# Altium footprint library 陪测板.PcbLib: 72 footprints (part 4 of 5)
Each footprint in its own frame and in the unit in brackets; x right, y up, seen from the top. Pads: shape width x height; smd on the part's side, far side on the other; paste and mask are expansions set on the pad; w line width, h text height; cw(c..) or ccw(c..) is an arc to the next point about the centre after c.
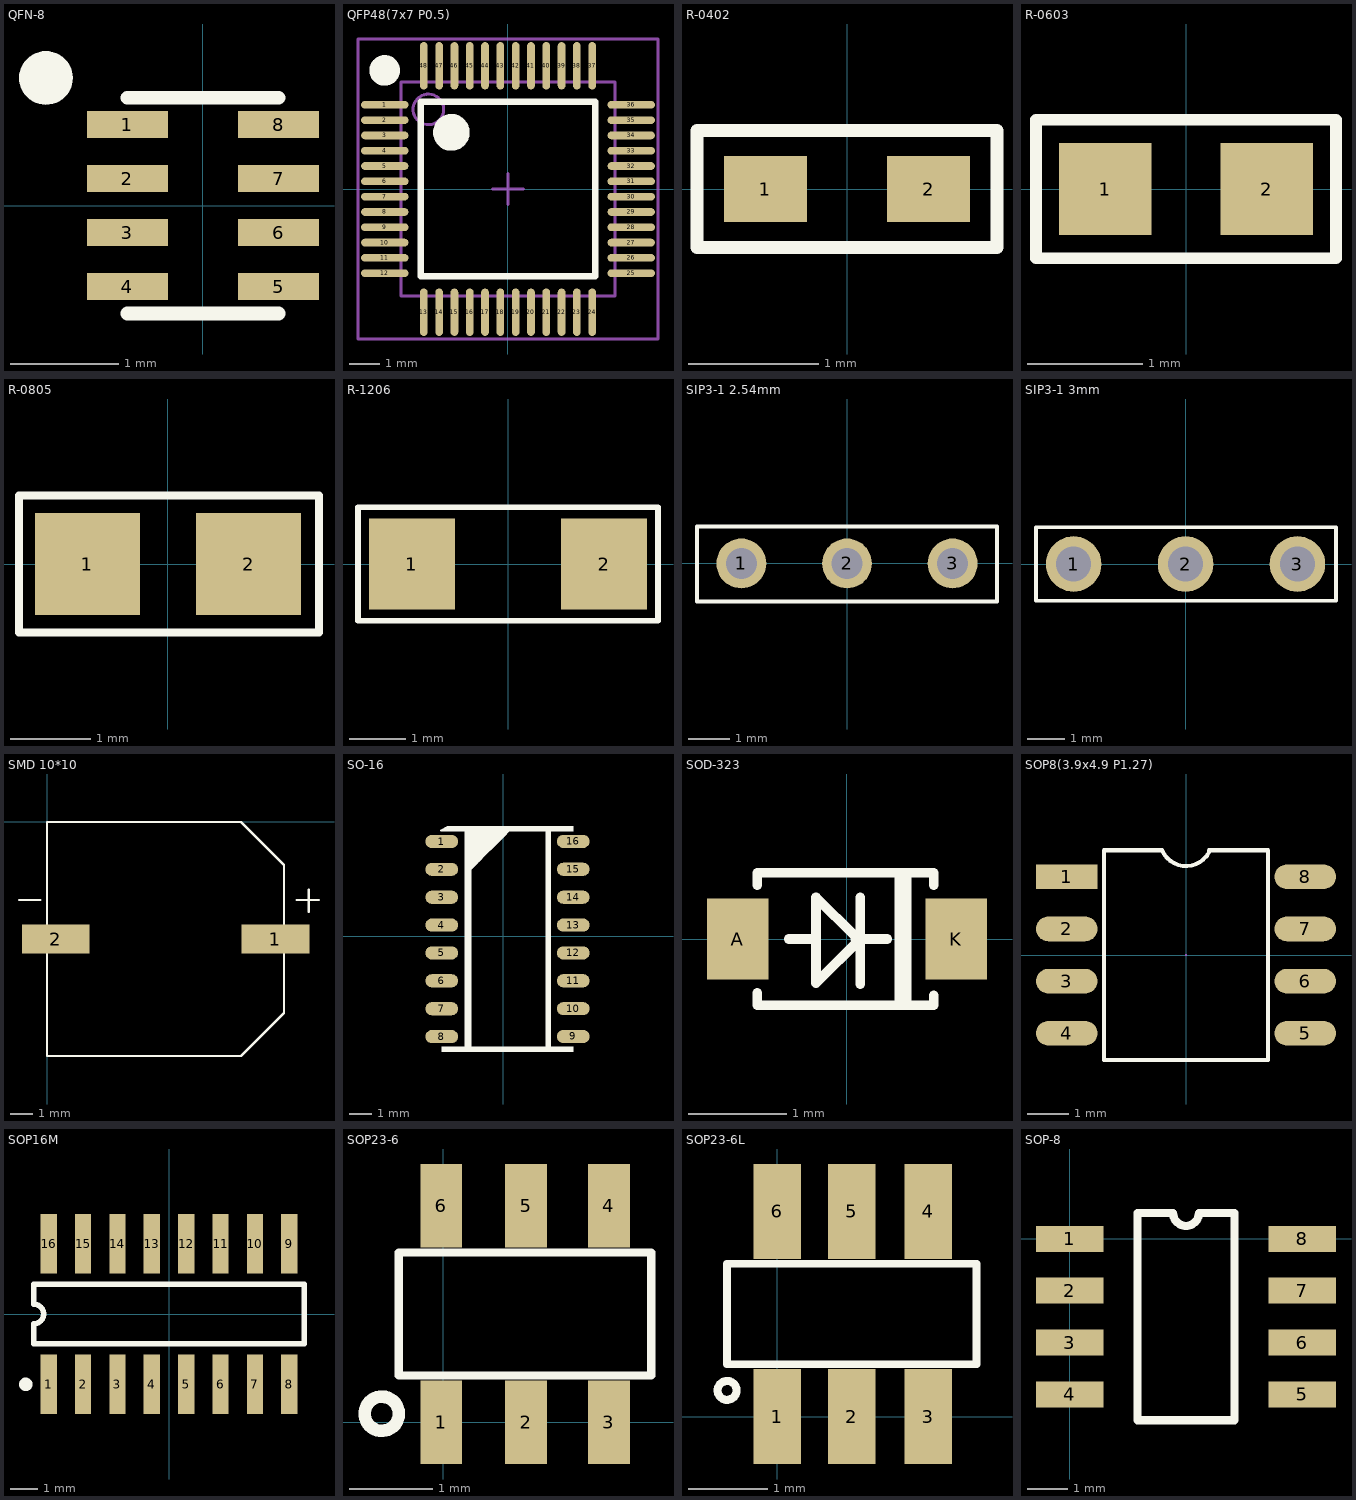
[diagram p3: the footprints below, top view; thin cyan lines are the x and y axes]

## QFN-8 [mm] "QFN-8 (1.5x2mm)"
height 0.9
pads (9):
  rect 0.75x0.25 smd: 1(-0.7,0.75) 2(-0.7,0.25) 3(-0.7,-0.25) 4(-0.7,-0.75) 5(0.7,-0.75) 6(0.7,-0.25) 7(0.7,0.25) 8(0.7,0.75)
  round 0.5 on Top Overlay: ""(-1.454,1.183)
Top Overlay:
  lines w0.127: -0.7,-1 0.7,-1 ; -0.7,1 0.125,1 ; -0.125,1 0.7,1
3D body: height 0.9, standoff 0, extent -0.7,-1 0.7,1

## QFP48(7x7 P0.5) [mm] "Thin QFP, 48-Leads, Body 7x7mm, Pitch 0.5mm, IPC High Density"
height 1.6
pads (49):
  round 0.05 on Mech1: 0(0,0)
  oval 1.55x0.25 smd: 1(-4.025,2.75) 2(-4.025,2.25) 3(-4.025,1.75) 4(-4.025,1.25) 5(-4.025,0.75) 6(-4.025,0.25) 7(-4.025,-0.25) 8(-4.025,-0.75) 9(-4.025,-1.25) 10(-4.025,-1.75) 11(-4.025,-2.25) 12(-4.025,-2.75) 25(4.025,-2.75) 26(4.025,-2.25) 27(4.025,-1.75) 28(4.025,-1.25) 29(4.025,-0.75) 30(4.025,-0.25) 31(4.025,0.25) 32(4.025,0.75) 33(4.025,1.25) 34(4.025,1.75) 35(4.025,2.25) 36(4.025,2.75)
  oval 0.25x1.55 smd: 13(-2.75,-4.025) 14(-2.25,-4.025) 15(-1.75,-4.025) 16(-1.25,-4.025) 17(-0.75,-4.025) 18(-0.25,-4.025) 19(0.25,-4.025) 20(0.75,-4.025) 21(1.25,-4.025) 22(1.75,-4.025) 23(2.25,-4.025) 24(2.75,-4.025) 37(2.75,4.025) 38(2.25,4.025) 39(1.75,4.025) 40(1.25,4.025) 41(0.75,4.025) 42(0.25,4.025) 43(-0.25,4.025) 44(-0.75,4.025) 45(-1.25,4.025) 46(-1.75,4.025) 47(-2.25,4.025) 48(-2.75,4.025)
Top Overlay:
  circle w0.6: c-1.85,1.85 r0.3
  circle w0.5: c-4.03,3.874 r0.25
  lines w0.2: -2.85,-2.85 2.85,-2.85 2.85,2.85 -2.85,2.85 -2.85,-2.85
Mechanical 13:
  circle w0.1: c-2.6,2.6 r0.5
Mechanical 15:
  lines w0.1: -0.5,0 0.5,0 ; 0,-0.5 0,0.5 ; -4.9,-4.9 4.9,-4.9 4.9,4.9 -4.9,4.9 -4.9,-4.9
Mechanical 16:
  lines w0.1: -3.5,-3.5 3.5,-3.5 3.5,3.5 -3.5,3.5 -3.5,-3.5
3D body "TQFP48.STEP": height 1.6, standoff 0, extent -4.45,-4.444 4.469,4.475

## R-0402 [mm]
pads (2):
  rect 0.635x0.508 smd: 1(-0.625,0) 2(0.625,0)
Top Overlay:
  lines w0.1: -1.15,-0.45 -1.15,0.45 1.15,0.45 1.15,-0.45 -1.15,-0.45
3D body "R-0402(1.0x0.5x0.3).STEP": height 0.3, standoff 0, extent -0.525,-0.25 0.475,0.25

## R-0603 [mm]
pads (2):
  rect 0.8x0.8 smd: 1(-0.7,0) 2(0.7,0)
Top Overlay:
  lines w0.1: -1.3,-0.6 -1.3,0.6 1.3,0.6 1.3,-0.6 -1.3,-0.6
3D body "R-0603(1.6x0.8x0.4).STEP": height 0.4, standoff 0, extent -0.775,-0.4 0.825,0.4

## R-0805 [mm]
pads (2):
  rect 1.3x1.27 smd: 1(-1,0) 2(1,0)
Top Overlay:
  lines w0.1: -0.356,-0.85 1.875,-0.85 1.875,0.85 -0.35,0.85 -1.85,0.85 -1.85,-0.85 -0.35,-0.85
3D body "C-0805(2.0x1.25x1.25).STEP": height 1.25, standoff 0, extent -0.975,-0.625 1.025,0.625

## R-1206 [mm]
pads (2):
  rect 1.52x1.6 smd: 1(-1.7,0) 2(1.7,0)
Top Overlay:
  lines w0.1: -2.65,-1 2.65,-1 2.65,1 -2.65,1 -2.65,-1
3D body "R-1206(3.2x1.6x0.55).STEP": height 0.55, standoff 0, extent -1.575,-0.8 1.625,0.8

## SIP3-1 2.54mm [mm]
pads (3):
  round 1.2 hole 0.75: 1(-2.54,0) 2(0,0) 3(2.54,0)
Top Overlay:
  lines w0.1: -3.607,-0.914 3.607,-0.914 3.607,0.889 -3.607,0.889 -3.607,-0.914

## SIP3-1 3mm [mm]
pads (3):
  round 1.5 hole 0.95: 1(-3.023,0) 2(0,0) 3(3.023,0)
Top Overlay:
  lines w0.1: -4.039,-0.991 -4.039,0.991 4.064,0.991 4.064,-0.991 -4.039,-0.991

## SMD 10*10 [mm]
pads (2):
  rect 3x1.3 smd: 1(10.109,-5.182) 2(0.381,-5.182)
Top Overlay:
  lines w0.1: -1.245,-3.454 -0.305,-3.454 ; 0.127,0 0,0 ; 11.049,-3.454 12.04,-3.454 ; 11.582,-3.988 11.582,-2.997 ; 0,0 0,-10.363 8.585,-10.363 10.49,-8.458 10.49,-8.026 10.49,-1.905 8.611,-0.025 8.585,0 0,0

## SO-16 [mm]
height 3.35
pads (16):
  oval 1.5x0.6 smd: 1(-2.794,4.318) 2(-2.794,3.048) 3(-2.794,1.778) 4(-2.794,0.508) 5(-2.794,-0.762) 6(-2.794,-2.032) 7(-2.794,-3.302) 8(-2.794,-4.572) 9(3.2,-4.57) 10(3.2,-3.3) 11(3.2,-2.03) 12(3.2,-0.76) 13(3.2,0.51) 14(3.2,1.78) 15(3.2,3.05) 16(3.2,4.32)
Top Overlay:
  region: 0,4.475 0.35,4.825 0.156,5.019 -0.194,4.669
  region: -1.525,2.95 -1.154,3.321 -1.348,3.516 -1.719,3.144
  region: -0.159,4.316 0.212,4.688 -0.119,5.019 -0.491,4.648
  region: -1.362,3.113 -0.929,3.546 -1.298,3.916 -1.732,3.482
  region: -0.362,4.113 0.063,4.537 -0.419,5.019 -0.844,4.594
  region: -1.112,3.363 -0.741,3.734 -1.366,4.359 -1.737,3.988
  region: -0.563,3.913 -0.163,4.312 -0.869,5.019 -1.269,4.619
  region: -0.828,3.652 -0.378,4.102 -1.298,5.022 -1.748,4.572
  region: -1.45,-5.15 -1.45,4.875 -1.75,4.875 -1.75,-5.15
  rectangle: -2.8,-5.275 3.2,-5.025
  rectangle: -2.521,4.775 3.2,5.025
  region: 2.175,-5.1 2.175,4.925 1.925,4.925 1.925,-5.1
  lines w0.1: -2.6,4.85 -2.55,4.85 -2.475,4.925 ; -2.375,4.825 -2.825,4.825 -2.525,4.975 -2.25,4.975 ; -1.575,4.325 -1.575,4.475 ; -1.55,4.425 -1.525,4.425

## SOD-323 [mm]
pads (2):
  rect 0.63x0.83 smd: A(-1.115,0) K(1.115,0)
Top Overlay:
  rectangle: 0.485,-0.675 0.66,0.675
  lines w0.1: -0.915,-0.55 -0.915,-0.675 0.885,-0.675 0.885,-0.575 ; -0.915,0.55 -0.915,0.675 0.885,0.675 0.885,0.55 ; -0.594,0 -0.34,0 ; 0.085,0 0.41,0 ; 0.085,0.025 -0.315,0.425 -0.315,-0.45 0.143,0.008 ; 0.135,-0.458 0.135,0.05 ; 0.135,-0.083 0.135,0.425
3D body "SOD-323.STEP": height 1, standoff 0, extent -1.29,-0.65 1.31,0.65

## SOP8(3.9x4.9 P1.27) [mm] "3.9x4.9 P1.27 (标准封装)"
height 1.2
pads (9):
  round 0.05 on Mech1: 0(0,0)
  rect 1.5x0.6 smd: 1(-2.9,1.905)
  oval 1.5x0.6 smd: 2(-2.9,0.635) 3(-2.9,-0.635) 4(-2.9,-1.905) 5(2.9,-1.905) 6(2.9,-0.635) 7(2.9,0.635) 8(2.9,1.905)
Top Overlay:
  lines w0.1: -0.591,2.55 -2,2.55 -2,-2.55 2,-2.55 2,2.55 0.563,2.55 ; -0.585,2.553 ccw(c0,2.8) 0.563,2.507
3D body "SOP8(3.9x4.9 P1.27).STEP": height 1.05, standoff 0, extent -3.075,-2.45 2.925,2.45

## SOP16M [mm]
pads (16):
  rect 0.6x2.2 smd: 1(-4.445,-2.6) 2(-3.175,-2.6) 3(-1.905,-2.6) 4(-0.635,-2.6) 5(0.635,-2.6) 6(1.905,-2.6) 7(3.175,-2.6) 8(4.445,-2.6) 9(4.445,2.6) 10(3.175,2.6) 11(1.905,2.6) 12(0.635,2.6) 13(-0.635,2.6) 14(-1.905,2.6) 15(-3.175,2.6) 16(-4.445,2.6)
Top Overlay:
  circle w0.25: c-5.295,-2.6 r0.125
  lines w0.2: -5,-1.1 5,-1.1 5,1.1 -5,1.1 -5,0.367 cw(c-5,0) -5,-0.367 -5,-1.1

## SOP23-6 [mm]
pads (6):
  rect 0.5x1 smd: 1(-0.025,0) 2(0.991,0) 3(1.981,0) 4(1.981,2.591) 5(0.991,2.591) 6(-0.025,2.591)
Top Overlay:
  circle w0.15: c-0.737,0.102 r0.205
  lines w0.1: -0.533,0.559 -0.533,2.032 2.489,2.032 2.489,0.559 -0.533,0.559

## SOP23-6L [mm]
pads (6):
  rect 0.6x1.2 smd: 1(0,0) 2(0.94,0) 3(1.905,0) 4(1.905,2.591) 5(0.94,2.591) 6(0,2.591)
Top Overlay:
  circle w0.1: c-0.635,0.33 r0.12
  lines w0.1: -0.635,0.66 2.515,0.66 2.515,1.93 -0.635,1.93 -0.635,0.66

## SOP-8 [mil]
pads (8):
  rect 65x25 smd: 1(0,0) 2(0,-50) 3(0,-100) 4(0,-150) 5(224.41,-150) 6(224.41,-100) 7(224.41,-50) 8(224.41,0)
Top Overlay:
  lines w7.87: 65.37,-175 65.37,25 99.7,25 ccw(c112.2,25) 124.7,25 159.04,25 159.04,-175 65.37,-175